# Altium footprint library IDETEC.PcbLib: 275 footprints (part 17 of 18)
Each footprint in its own frame and in the unit in brackets; x right, y up, seen from the top. Pads: shape width x height; smd on the part's side, far side on the other; paste and mask are expansions set on the pad; w line width, h text height; cw(c..) or ccw(c..) is an arc to the next point about the centre after c.
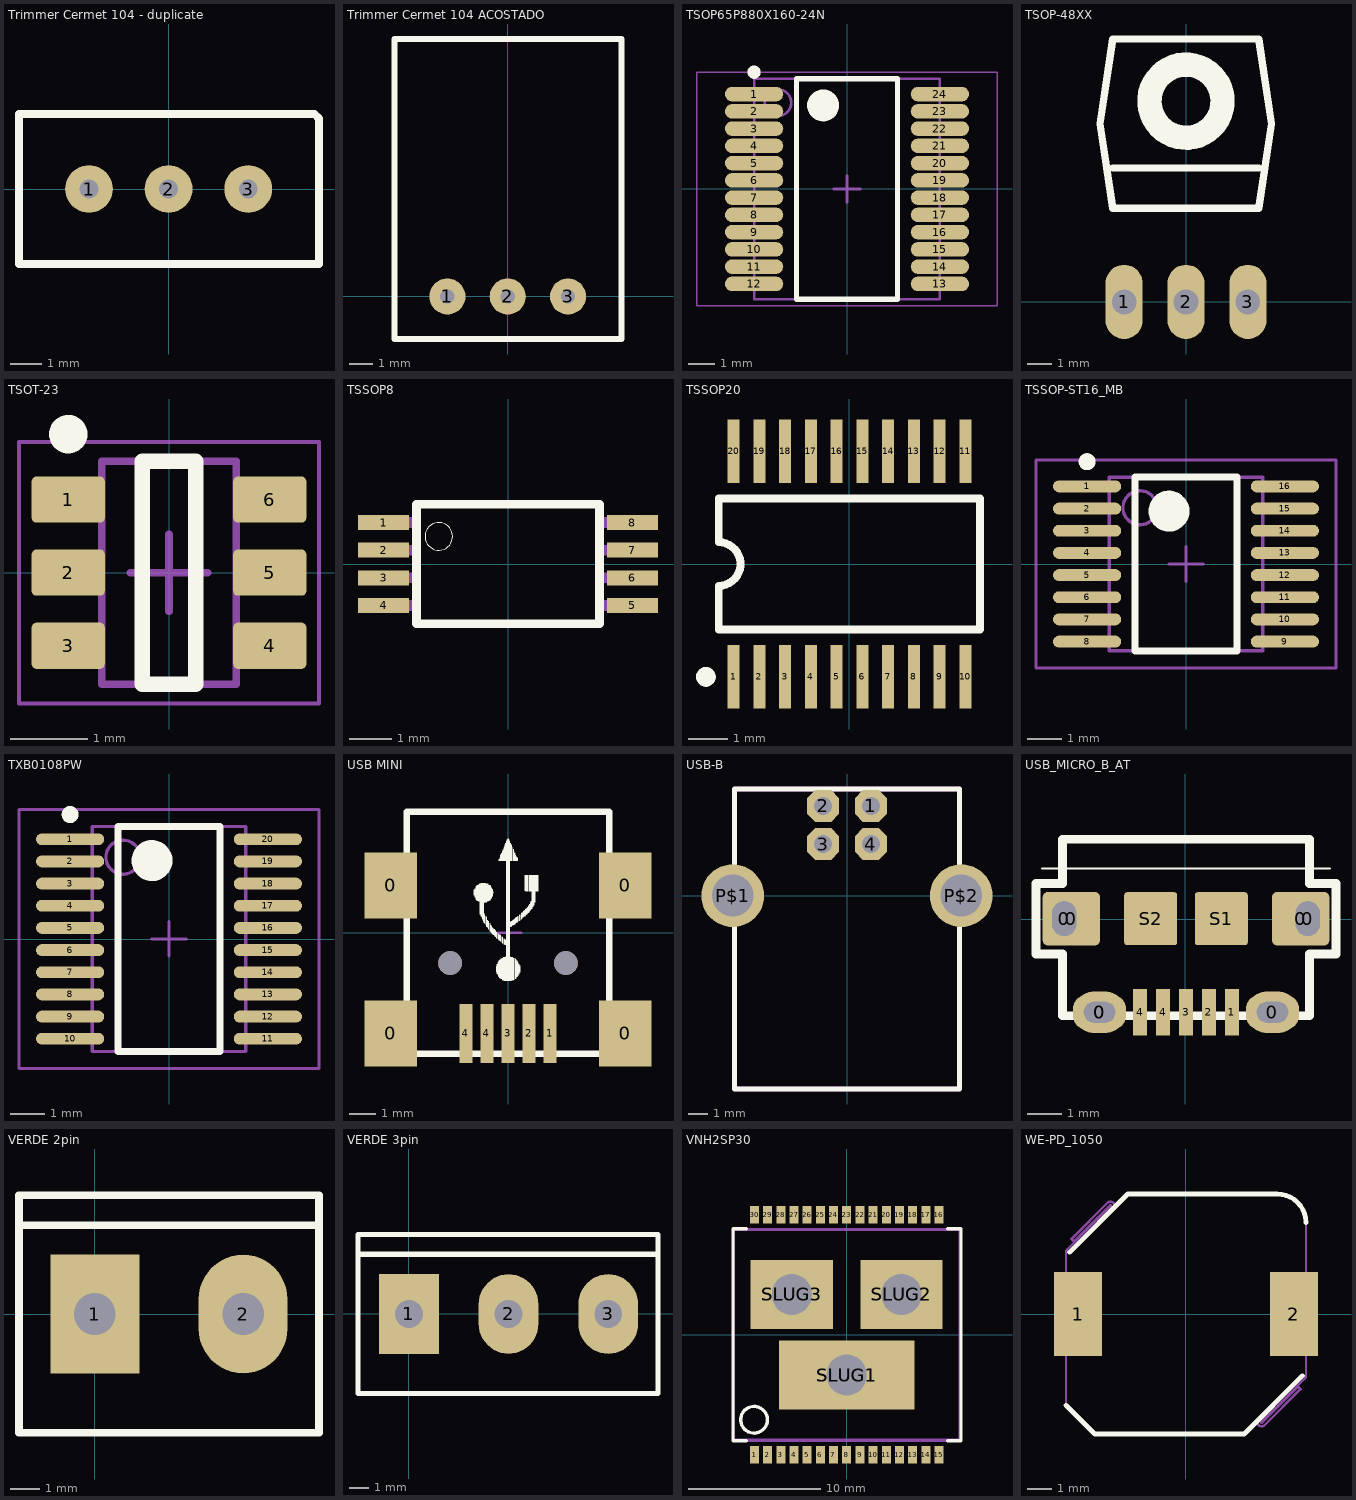
[diagram p16: the footprints below, top view; thin cyan lines are the x and y axes]

## Trimmer Cermet 104 - duplicate [mil]
pads (3):
  round 60 hole 23.62: 1(-100,0) 2(0,0) 3(100,0)
Top Overlay:
  lines w10: -187.99,-94.49 -187.99,94.49 183.07,94.49 188.98,88.58 188.98,-94.49 -187.99,-94.49
3D body "User Library-3296W.STEP": height 454.72, standoff -62.99, extent -187.6,-94.49 187.59,94.49

## Trimmer Cermet 104 ACOSTADO [mil]
pads (3):
  round 60 hole 23.62: 1(-100,0) 2(0,0) 3(100,0)
Top Overlay:
  lines w10: -187.99,-70.47 -187.99,426.77 188.98,426.77 188.98,-70.47 -187.99,-70.47
3D body "User Library-3296W.STEP": height 188.98, standoff 0, extent -187.79,-37.2 187.4,480.51

## TSOP65P880X160-24N [mm] "TSOP, 24-Leads, Body 8,05x6,30mm, Pitch 0,65mm, IPC Medium Density"
height 1.6
pads (24):
  oval 2.2x0.55 smd: 1(-3.5,3.575) 2(-3.5,2.925) 3(-3.5,2.275) 4(-3.5,1.625) 5(-3.5,0.975) 6(-3.5,0.325) 7(-3.5,-0.325) 8(-3.5,-0.975) 9(-3.5,-1.625) 10(-3.5,-2.275) 11(-3.5,-2.925) 12(-3.5,-3.575) 13(3.5,-3.575) 14(3.5,-2.925) 15(3.5,-2.275) 16(3.5,-1.625) 17(3.5,-0.975) 18(3.5,-0.325) 19(3.5,0.325) 20(3.5,0.975) 21(3.5,1.625) 22(3.5,2.275) 23(3.5,2.925) 24(3.5,3.575)
Top Overlay:
  circle w0.6: c-0.9,3.15 r0.3
  circle w0.25: c-3.5,4.4 r0.125
  lines w0.2: -1.9,-4.15 1.9,-4.15 1.9,4.15 -1.9,4.15 -1.9,-4.15
Mechanical 13:
  circle w0.1: c-2.6,3.25 r0.5
  lines w0.1: -3.5,-4.15 3.5,-4.15 3.5,4.15 -3.5,4.15 -3.5,-4.15
Mechanical 15:
  lines w0.05: -5.65,-4.4 5.65,-4.4 5.65,4.4 -5.65,4.4 -5.65,-4.4
  lines w0.1: -0.5,0 0.5,0 ; 0,-0.5 0,0.5
3D body "User Library-SSOP 24 PIN_.STEP": height 1.9, standoff -0.09, extent -3.95,-4.315 3.95,4.315

## TSOP-48XX [mil]
height 196.85
pads (3):
  oval 60x120 hole 40: 1(-100,0) 2(0,0) 3(100,0)
Top Overlay:
  lines w11.81: -118.46,216.3 117.76,216.3 ; -138.94,288.15 -118.46,424.96 117.76,424.96 138.23,288.15 117.76,151.34 -118.46,151.34 -138.94,288.15
  lines w39.37: 58.92,328.37 ccw(c0,324.45) 58.98,327.44
3D body "User Library-IR reciver.STEP": height 213.23, standoff -93.29, extent -118.11,-13.11 118.11,502.85

## TSOT-23 [mm] "SOT23, 6-Leads, Body 2,90x2,80mm, Pitch 0,95mm, IPC Medium Density"
height 1
pads (6):
  rrect20% 0.95x0.6 smd: 1(-1.31,0.95) 2(-1.31,0) 3(-1.31,-0.95) 4(1.31,-0.95) 5(1.31,0) 6(1.31,0.95)
Top Overlay:
  circle w0.25: c-1.31,1.8 r0.125
  lines w0.2: -0.35,-1.45 0.35,-1.45 0.35,1.45 -0.35,1.45 -0.35,-1.45
Mechanical 13:
  lines w0.1: -0.875,-1.45 -0.875,1.45 0.875,1.45 0.875,-1.45 -0.875,-1.45
Mechanical 15:
  lines w0.05: -1.95,-1.7 -1.95,1.7 1.95,1.7 1.95,-1.7 -1.95,-1.7
  lines w0.1: -0.5,0 0.5,0 ; 0,-0.5 0,0.5
3D body "User Library-TSOT-23-6(S6).STEP": height 1, standoff 0, extent -1.412,-1.45 1.412,1.45

## TSSOP8 [mm] "TSSOP8"
pads (8):
  rect 1.2x0.35 smd: 1(-2.925,0.975) 2(-2.925,0.325) 3(-2.925,-0.325) 4(-2.925,-0.975) 5(2.925,-0.975) 6(2.925,-0.325) 7(2.925,0.325) 8(2.925,0.975)
Top Overlay:
  circle w0: c-1.625,0.65 r0.325
  lines w0.203: -2.15,-1.4 -2.15,1.4 2.15,1.4 2.15,-1.4 -2.15,-1.4
Mechanical 16:
  rectangle: 2.2,0.85 3.2,1.1
  rectangle: 2.2,0.2 3.2,0.45
  rectangle: 2.2,-0.45 3.2,-0.2
  rectangle: 2.2,-1.1 3.2,-0.85
  rectangle: -3.2,-1.1 -2.2,-0.85
  rectangle: -3.2,-0.45 -2.2,-0.2
  rectangle: -3.2,0.2 -2.2,0.45
  rectangle: -3.2,0.85 -2.2,1.1
3D body "User Library-TSS0P8.STEP": height 1.09, standoff 0, extent -3.11,-1.573 3.17,1.427

## TSSOP20 [mm] "Shrink Small Outline; 20 Leads; Body Width 4.4 mm; Pitch 0.65 mm"
height 1.1
pads (20):
  rect 0.3x1.6 smd: 1(-2.925,-2.85) 2(-2.275,-2.85) 3(-1.625,-2.85) 4(-0.975,-2.85) 5(-0.325,-2.85) 6(0.325,-2.85) 7(0.975,-2.85) 8(1.625,-2.85) 9(2.275,-2.85) 10(2.925,-2.85) 11(2.925,2.85) 12(2.275,2.85) 13(1.625,2.85) 14(0.975,2.85) 15(0.325,2.85) 16(-0.325,2.85) 17(-0.975,2.85) 18(-1.625,2.85) 19(-2.275,2.85) 20(-2.925,2.85)
Top Overlay:
  circle w0.25: c-3.625,-2.85 r0.125
  lines w0.2: -3.3,-1.65 -3.3,-0.55 ccw(c-3.3,0) -3.3,0.55 -3.3,1.65 3.3,1.65 3.3,-1.65 -3.3,-1.65
3D body "User Library-tssop-20-1.STEP": height 1.2, standoff 0, extent -3.3,-3.3 3.3,3.3

## TSSOP-ST16_MB [mm] "TSSOP-ST16_MB"
pads (16):
  oval 2x0.35 smd: 1(-2.9,2.275) 2(-2.9,1.625) 3(-2.9,0.975) 4(-2.9,0.325) 5(-2.9,-0.325) 6(-2.9,-0.975) 7(-2.9,-1.625) 8(-2.9,-2.275) 9(2.9,-2.275) 10(2.9,-1.625) 11(2.9,-0.975) 12(2.9,-0.325) 13(2.9,0.325) 14(2.9,0.975) 15(2.9,1.625) 16(2.9,2.275)
Top Overlay:
  circle w0.6: c-0.5,1.55 r0.3
  circle w0.25: c-2.9,3 r0.125
  lines w0.2: -1.5,-2.55 1.5,-2.55 1.5,2.55 -1.5,2.55 -1.5,-2.55
Mechanical 13:
  circle w0.1: c-1.35,1.65 r0.5
  lines w0.1: -2.25,-2.55 2.25,-2.55 2.25,2.55 -2.25,2.55 -2.25,-2.55
Mechanical 15:
  lines w0.1: -0.5,0 0.5,0 ; 0,-0.5 0,0.5 ; -4.4,-3.05 4.4,-3.05 4.4,3.05 -4.4,3.05 -4.4,-3.05
3D body "SW3dPS-SSOP16.STEP": height 1.05, standoff -0.05, extent -3.047,-2.464 2.947,2.514

## TXB0108PW [mm] "TSSOP20_MB"
pads (20):
  oval 2x0.35 smd: 1(-2.9,2.925) 2(-2.9,2.275) 3(-2.9,1.625) 4(-2.9,0.975) 5(-2.9,0.325) 6(-2.9,-0.325) 7(-2.9,-0.975) 8(-2.9,-1.625) 9(-2.9,-2.275) 10(-2.9,-2.925) 11(2.9,-2.925) 12(2.9,-2.275) 13(2.9,-1.625) 14(2.9,-0.975) 15(2.9,-0.325) 16(2.9,0.325) 17(2.9,0.975) 18(2.9,1.625) 19(2.9,2.275) 20(2.9,2.925)
Top Overlay:
  circle w0.25: c-2.9,3.65 r0.125
  circle w0.6: c-0.5,2.3 r0.3
  lines w0.2: -1.5,-3.3 -1.5,3.3 1.5,3.3 1.5,-3.3 -1.5,-3.3
Mechanical 13:
  circle w0.1: c-1.35,2.4 r0.5
  lines w0.1: -2.25,-3.3 -2.25,3.3 2.25,3.3 2.25,-3.3 -2.25,-3.3
Mechanical 15:
  lines w0.1: -0.5,0 0.5,0 ; 0,-0.5 0,0.5 ; -4.4,-3.8 -4.4,3.8 4.4,3.8 4.4,-3.8 -4.4,-3.8
3D body "User Library-tssop-20-1.STEP": height 1.2, standoff 0, extent -3.3,-3.3 3.3,3.3

## USB MINI [mm] "USB MINI"
height 1.1
pads (11):
  rect 2x2.5 smd: 0(-4.45,-3.83) 0(-4.45,1.795) 0(4.45,-3.83) 0(4.45,1.795)
  rect 0.5x2.25 smd: 1(1.6,-3.83) 2(0.8,-3.83) 3(0,-3.83) 4(-1.6,-3.83) 4(-0.8,-3.83)
  round 0.9 hole 0.9: ""(-2.2,-1.155) ""(2.2,-1.155)
Top Overlay:
  drawing of 178 lines, arcs and shapes, not listed
Mechanical 15:
  lines w0.1: -0.5,0 0.5,0 ; 0,-0.5 0,0.5
3D body "SW3dPS-USB_mini_B.STEP": height 3.95, standoff -1, extent -5.35,-4.48 5.35,4.72

## USB-B [mil] "USB TypeB"
pads (6):
  oct 66x66 hole 37.4: 1(49.21,185.43) 2(-49.21,185.43) 3(-49.21,106.69) 4(49.21,106.69)
  round 129.91 hole 86.61: P$1(-236.22,0) P$2(236.22,0)
Top Overlay:
  lines w10: -232.28,-399.61 232.28,-399.61 232.28,220.47 -232.28,220.47 -232.28,-399.61
Mechanical 16:
  lines w10: -232.28,-399.61 232.28,-399.61 232.28,220.47 -232.28,220.47 -232.28,-399.61
3D body "User Library-JST_UBB-4R-D14T-4D.STEP": height 444.88, standoff -134.65, extent -293.54,-407.71 293.04,234.02

## USB_MICRO_B_AT [mil] "USB_MICRO_B_AT"
pads (15):
  oval 47.24x59.06 hole 27.56 slot 39.37 at 90 deg: 0(-137.33,0.67) 0(138.67,0.67)
  rrect20% 65x61 smd: 0(-129.33,0.67) 0(130.67,0.67)
  oval 59.06x47.24 hole 23.62 slot 35.43 at 0 deg: 0(-97.33,-105.33) ""(98.67,-105.33)
  rrect80% 60x40 smd: 0(-97.33,-105.33) 0(98.67,-105.33)
  rrect10% 16x53 smd: 1(52.67,-105.33) 2(26.67,-105.33) 3(0.67,-105.33) 4(-51.33,-105.33) 4(-25.33,-105.33)
  rrect10% 60x60 smd: S1(40.67,0.67) S2(-39.33,0.67)
Top Overlay:
  lines w2: -162.58,57.67 163.92,57.67
  lines w10: -169.33,-39.33 -169.33,40.67 -139.33,40.67 -139.33,90.67 140.67,90.67 140.67,40.67 170.67,40.67 170.67,-39.33 140.67,-39.33 140.67,-109.33 -139.33,-109.33 -139.33,-39.33 -169.33,-39.33
Top Paste:
  lines w5: -153.33,-22.33 -153.33,23.67 ; -120.33,-23.33 -120.33,23.67 cw(c-119.33,23.67) -119.33,24.67 -115.33,24.67 -115.33,-22.33 -110.33,-22.33 -110.33,23.67 -105.33,23.67 -105.33,-22.33 ; -113.33,-118.33 cw(c-113.33,-113.33) -118.33,-113.33 -118.33,-97.33 cw(c-113.33,-97.33) -113.33,-92.33 ; -80.33,-117.33 ccw(c-80.33,-112.33) -75.33,-112.33 -75.33,-98.33 ccw(c-80.33,-98.33) -80.33,-93.33 ; 82.67,-118.33 cw(c82.67,-113.33) 77.67,-113.33 77.67,-97.33 cw(c82.67,-97.33) 82.67,-92.33 ; 106.67,-24.33 106.67,25.67 108.67,25.67 108.67,-24.33 112.67,-24.33 112.67,25.67 117.67,25.67 117.67,-25.33 ; 114.67,-118.33 ccw(c114.67,-112.33) 120.67,-112.33 119.67,-97.33 ccw(c114.67,-97.33) 114.67,-92.33 ; 116.67,-25.33 117.67,-25.33 ; 121.67,25.67 121.67,-25.33 117.67,-25.33 ; 155.67,-22.33 155.67,23.67 ; -157.33,-16.33 ccw(c-147.33,-16.33) -147.33,-26.33 -111.33,-26.33 ccw(c-111.33,-16.33) -101.33,-16.33 -101.33,17.67 ccw(c-111.33,17.67) -111.33,27.67 -147.33,27.67 ccw(c-147.33,17.67) -157.33,17.67 -157.33,-16.33 ; -123.33,-112.33 ccw(c-113.33,-112.33) -113.33,-122.33 -81.33,-122.33 ccw(c-81.33,-112.33) -71.33,-112.33 -71.33,-98.33 ccw(c-81.33,-98.33) -81.33,-88.33 -113.33,-88.33 ccw(c-113.33,-98.33) -123.33,-98.33 -123.33,-112.33 ; 72.67,-112.33 ccw(c82.67,-112.33) 82.67,-122.33 114.67,-122.33 ccw(c114.67,-112.33) 124.67,-112.33 124.67,-98.33 ccw(c114.67,-98.33) 114.67,-88.33 82.67,-88.33 ccw(c82.67,-98.33) 72.67,-98.33 72.67,-112.33 ; 101.67,-16.33 ccw(c111.67,-16.33) 111.67,-26.33 149.67,-26.33 ccw(c149.67,-16.33) 159.67,-16.33 159.67,17.67 ccw(c149.67,17.67) 149.67,27.67 111.67,27.67 ccw(c111.67,17.67) 101.67,17.67 101.67,-16.33
3D body "User Library-Micro USB-B_Molex_105017-0001.step": height 105.31, standoff -24.61, extent -159.65,-110.71 163.19,103.07

## VERDE 2pin [mm] "bornera verde"
pads (2):
  rect 3x4 hole 1.4: 1(0,0)
  oval 3x4 hole 1.4: 2(5,0)
Top Overlay:
  lines w0.254: -2.56,3 7.56,3 ; -2.56,-4 -2.56,4 7.56,4 7.56,-4 -2.56,-4
3D body "User Library-klema-5mm-2pin.STEP": height 14, standoff -4, extent -2.496,-5.508 7.504,4.992

## VERDE 3pin [mm] "bornera verde"
pads (3):
  rect 3x4 hole 1.4: 1(0,0)
  oval 3x4 hole 1.4: 2(5,0) 3(10,0)
Top Overlay:
  lines w0.254: -2.56,3 12.5,3 ; -2.56,-4 12.5,-4 12.5,4 -2.56,4 -2.56,0.44 -2.56,-4
3D body "User Library-klema-5mm-3pin.STEP": height 14, standoff -4, extent -2.52,-5.51 12.48,4.99

## VNH2SP30 [mil] "VNH2SP30"
pads (36):
  rect 27x52 smd: 1(-275.59,-358.27) 2(-236.22,-358.27) 3(-196.85,-358.27) 4(-157.48,-358.27) 5(-118.11,-358.27) 6(-78.74,-358.27) 7(-39.37,-358.27) 8(0,-358.27) 9(40,-358.27) 10(79,-358.27) 11(119,-358.27) 12(158,-358.27) 13(197,-358.27) 14(237,-358.27) 15(276,-358.27) 16(276,359) 17(237,359) 18(197,359) 19(158,359) 20(119,359) 21(79,359) 22(40,359) 23(0,359) 24(-39.37,359) 25(-78.74,359) 26(-118.11,359) 27(-157.48,359) 28(-196.85,359) 29(-236.22,359) 30(-275.59,359)
  rect 406x207 smd: SLUG1(0,-120.08)
  oval 314.96x207.01 hole 118.11 slot 122.05 at 90 deg: SLUG1(0,-120.08)
  rect 246x207 smd: SLUG2(164,121) SLUG3(-163.98,121)
  oval 236.22x207.01 hole 118.11 slot 122.05 at 90 deg: SLUG2(164,121) SLUG3(-163.98,121)
Top Overlay:
  circle w10: c-276.97,-253.94 r40
  lines w10: -300.59,-316.93 -339.96,-316.93 -339.96,317 -300.59,317 ; 302,-316.93 342,-316.93 342,317 302,317
Mechanical 16:
  lines w10: -338.58,-314.96 339,-314.96 339,315 -338.58,315 -338.58,-314.96
3D body "SW3dPS-PowSO30-ST.STEP": height 93.41, standoff -3.69, extent -338.27,-372.44 338.9,375.59

## WE-PD_1050 [mm] "WERTH"
height 5
pads (2):
  rect 2x3.5 smd: 1(-4.5,0) 2(4.5,0)
Top Overlay:
  lines w0.2: -5,-3.8 -3.8,-5 -1.6,-5 2.384,-5 ; -4.85,2.575 -2.425,5 ; -2.384,5 1.6,5 3.8,5 cw(c3.8,3.8) 5,3.8 ; 2.425,-5 4.85,-2.575
Mechanical 5:
  lines w0.1: -5,-1.6 -5,-3.8 -3.8,-5 2.425,-5 4.85,-2.575 ; -5,-1.5 -5,1.5 -5,2.566 cw(c-4.83,2.566) -4.95,2.687 -3.137,4.5 ccw(c-3.151,4.514) -3.165,4.529 -4.671,3.022 -4.777,3.128 -3.271,4.635 cw(c-3.151,4.514) -3.03,4.394 ; -4.85,2.575 -2.425,5 3.8,5 cw(c3.8,3.8) 5,3.8 5,1.6 ; 3.03,-4.394 ccw(c3.151,-4.514) 3.271,-4.635 4.777,-3.128 4.671,-3.022 3.165,-4.529 cw(c3.151,-4.514) 3.137,-4.5 4.95,-2.687 ccw(c4.83,-2.566) 5,-2.566 5,-1.5 5,1.5
3D body "7447714xx.stp": height 4.75, standoff -0.05, extent -5,-5 5,5